# Altium footprint library Conectors.PcbLib: 123 footprints (part 5 of 8)
Each footprint in its own frame and in the unit in brackets; x right, y up, seen from the top. Pads: shape width x height; smd on the part's side, far side on the other; paste and mask are expansions set on the pad; w line width, h text height; cw(c..) or ccw(c..) is an arc to the next point about the centre after c.
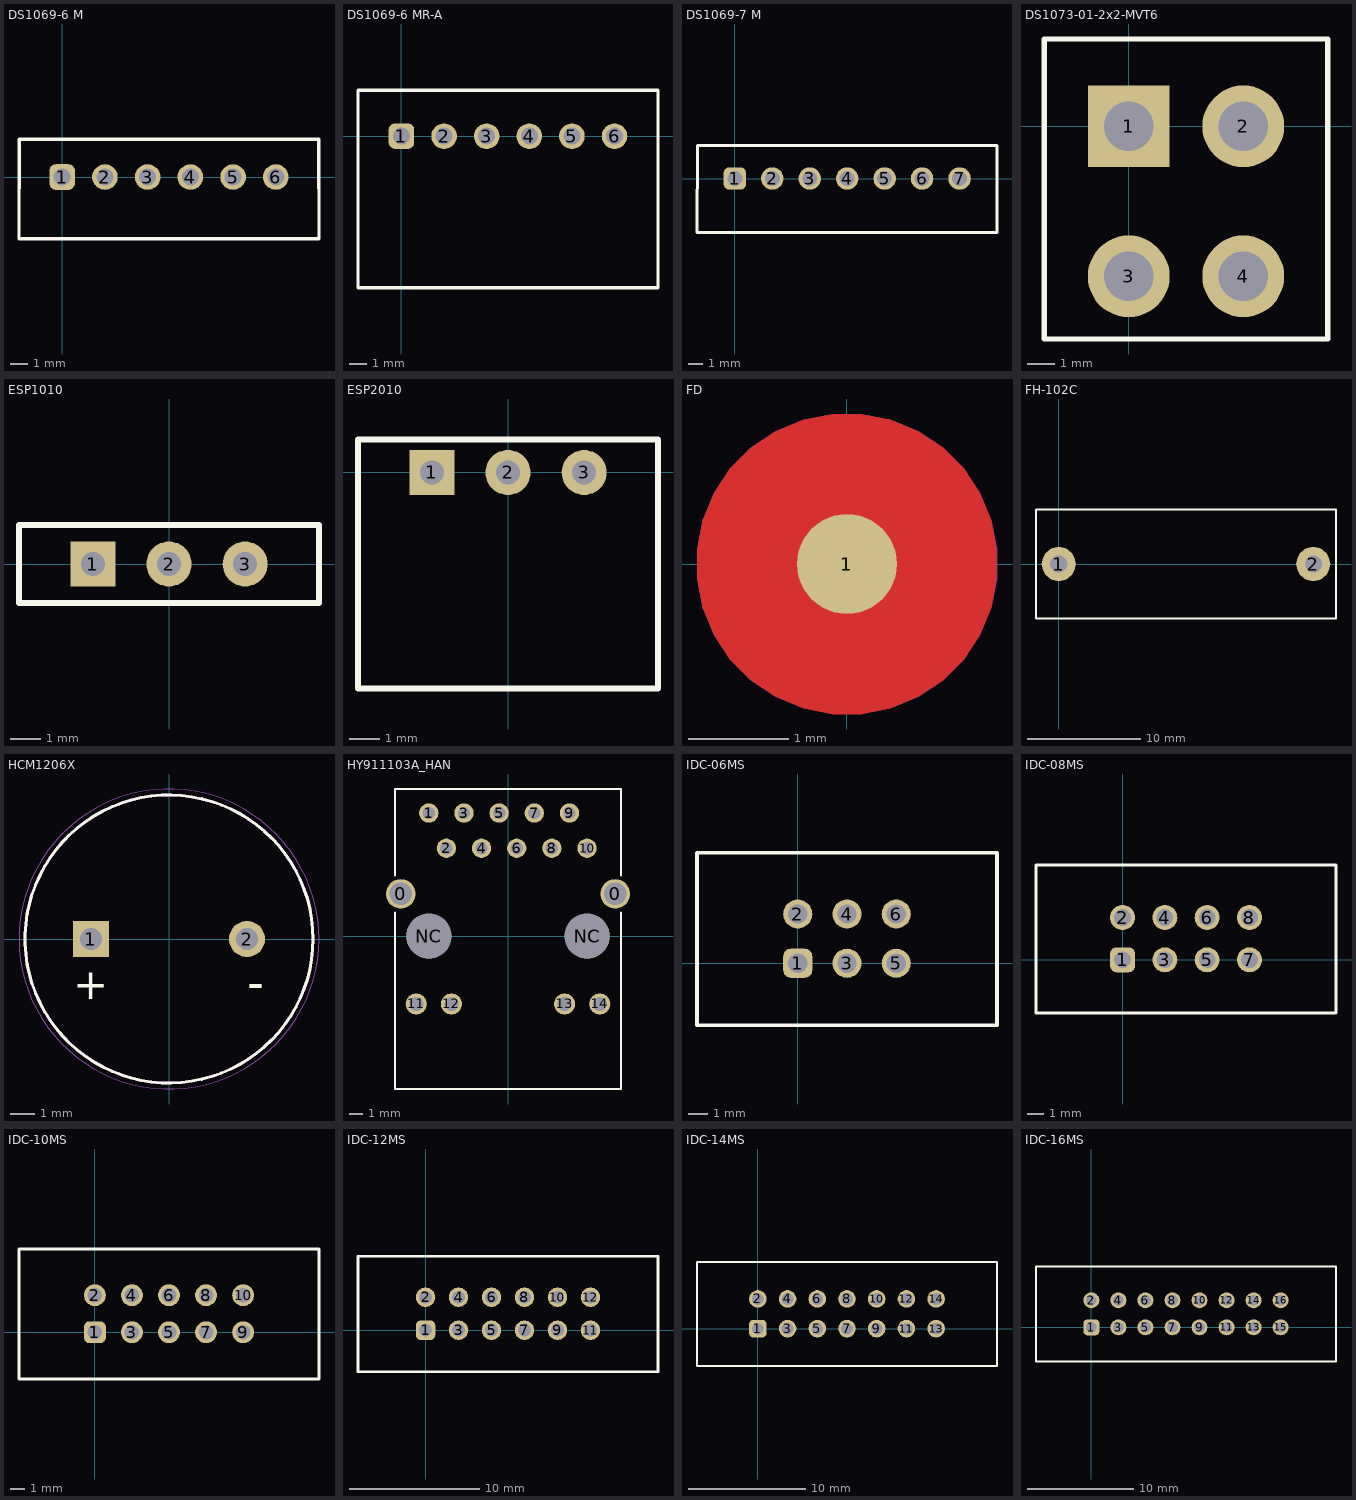
[diagram p4: the footprints below, top view; thin cyan lines are the x and y axes]

## DS1069-6 M [mm]
pads (6):
  rrect50% 1.5x1.5 hole 1: 1(0,0)
  round 1.5 hole 1: 2(2.5,0) 3(5,0) 4(7.5,0) 5(10,0) 6(12.5,0)
Top Overlay:
  lines w0.2: -2.526,-3.6 15.026,-3.6 15,2.2 -2.5,2.2 -2.526,-3.6
3D body "User Library-CWF-6.step": height 7, standoff -3.5, extent -2.5,-3.55 15,2.2

## DS1069-6 MR-A [mm]
pads (6):
  rrect50% 1.5x1.5 hole 1: 1(0,0)
  round 1.5 hole 1: 2(2.5,0) 3(5,0) 4(7.5,0) 5(10,0) 6(12.5,0)
Top Overlay:
  lines w0.2: -2.55,-8.9 15.05,-8.9 15.05,2.7 -2.55,2.7 -2.55,-8.9
3D body "User Library-DS1069-6 CWF-6R.step": height 5.75, standoff -3.5, extent -2.5,-8.88 15,2.62

## DS1069-7 M [mm]
pads (7):
  rrect50% 1.5x1.5 hole 1: 1(0,0)
  round 1.5 hole 1: 2(2.5,0) 3(5,0) 4(7.5,0) 5(10,0) 6(12.5,0) 7(15,0)
Top Overlay:
  lines w0.2: -2.526,-3.6 17.5,-3.6 17.5,2.2 -2.5,2.2 -2.526,-3.6
3D body "User Library-CWF-7.step": height 7, standoff -3.5, extent -2.5,-3.55 17.5,2.2

## DS1073-01-2x2-MVT6 [mm]
pads (4):
  rect 3x3 hole 1.8: 1(0,0)
  round 3 hole 1.8: 2(4.2,0) 3(0,-5.5) 4(4.2,-5.5)
Top Overlay:
  lines w0.2: -3.1,-7.8 7.3,-7.8 7.3,3.2 -3.1,3.2 -3.1,-7.8
3D body "039310040.stp": height 12.8, standoff -3.5, extent -3.1,-7.8 7.3,3.2

## ESP1010 [mm]
pads (3):
  rect 1.5x1.5 hole 0.8: 1(-2.54,0)
  round 1.5 hole 0.8: 2(0,0) 3(2.54,0)
Top Overlay:
  lines w0.2: -5,-1.3 -5,1.3 5,1.3 5,-1.3 -5,-1.3
3D body "slide_switch.stp": height 6.5, standoff -5.5, extent -5,-1.25 5,1.25

## ESP2010 [mm]
pads (3):
  rect 1.5x1.5 hole 0.8: 1(-2.54,0)
  round 1.5 hole 0.8: 2(0,0) 3(2.54,0)
Top Overlay:
  lines w0.2: -5,-7.2 5,-7.2 5,1.1 -5,1.1 -5,-7.2
3D body "Деталь3.STEP": height 2.5, standoff -2.55, extent -5,-7.2 5,0.25

## FD [mm]
pads (1):
  round 1 all layers, no hole paste+0 mask+0: 1(0,0)
Top Layer:
  pour cut-out: -1.5,0 -1.5,-0.148 -1.442,-0.438 -1.329,-0.711 -1.165,-0.956 -0.956,-1.165 -0.711,-1.329 -0.438,-1.442 -0.148,-1.5 0,-1.5 0.148,-1.5 0.438,-1.442 0.711,-1.329 0.956,-1.165 1.165,-0.956 1.329,-0.711 1.442,-0.438 1.5,-0.148 1.5,0 1.5,0.148 1.442,0.438 1.329,0.711 1.165,0.956 0.956,1.165 0.711,1.329 0.438,1.442 0.148,1.5 0,1.5 -0.148,1.5 -0.438,1.442 -0.711,1.329 -0.956,1.165 -1.165,0.956 -1.329,0.711 -1.442,0.438 -1.5,0.148
Bottom Layer:
  pour cut-out: -1.5,0 -1.5,-0.148 -1.442,-0.438 -1.329,-0.711 -1.165,-0.956 -0.956,-1.165 -0.711,-1.329 -0.438,-1.442 -0.148,-1.5 0,-1.5 0.148,-1.5 0.438,-1.442 0.711,-1.329 0.956,-1.165 1.165,-0.956 1.329,-0.711 1.442,-0.438 1.5,-0.148 1.5,0 1.5,0.148 1.442,0.438 1.329,0.711 1.165,0.956 0.956,1.165 0.711,1.329 0.438,1.442 0.148,1.5 0,1.5 -0.148,1.5 -0.438,1.442 -0.711,1.329 -0.956,1.165 -1.165,0.956 -1.329,0.711 -1.442,0.438 -1.5,0.148

## FH-102C [mm]
pads (2):
  round 3 hole 1.5: 1(0,0) 2(22.4,0)
Top Overlay:
  lines w0.2: -2,-4.8 -2,4.8 24.4,4.8 24.4,-4.8 -2,-4.8
3D body "FH-102C.stp": height 15.5, standoff -5.1, extent -1.95,-4.75 24.35,4.75

## HCM1206X [mm]
pads (2):
  rect 1.5x1.5 hole 0.9: 1(-3.25,0)
  round 1.5 hole 0.9: 2(3.25,0)
Top Overlay:
  circle w0.127: c0,0 r6
  text "+" at -4,-2.5 h1.27
  text "-" at 3.25,-2.5 h1.42
Mechanical 13:
  circle w0.127: c0,0 r6
Mechanical 15:
  circle w0.05: c0,0 r6.25
3D body "CMT-1285C-035.STEP": height 8.51, standoff -5.49, extent -6,-6 6,6

## HY911103A_HAN [mil]
pads (18):
  round 84 hole 64: 0(-304.92,120.08) 0(304.92,120.08)
  round 55 hole 35 mask+0: 1(-225.2,350) 2(-175.2,250) 3(-125.2,350) 4(-75.2,250) 5(-25.2,350) 6(24.8,250) 7(74.8,350) 8(124.8,250) 9(174.8,350) 10(224.8,250)
  round 60 hole 40 mask+0: 11(-260.83,-192.91) 12(-160.83,-192.91) 13(160.83,-192.91) 14(260.83,-192.91)
  round 128 hole 128 unplated: NC(-225,0) NC(225,0)
Top Overlay:
  lines w6: -321,67.38 -321,-434.61 321,-434.61 321,67.38 ; -321,172.78 -321,418.39 321,418.39 321,172.78
3D body "HR911130A.sldprt": height 551.18, standoff -98.43, extent -312.01,-429.53 313.19,412.99

## IDC-06MS [mm]
pads (6):
  rrect50% 1.5x1.5 hole 1: 1(0,0)
  round 1.5 hole 1: 2(0,2.54) 3(2.54,0) 4(2.54,2.54) 5(5.08,0) 6(5.08,2.54)
Top Overlay:
  lines w0.2: -5.2,-3.2 10.28,-3.2 10.28,5.7 -5.2,5.7 -5.2,-3.2
3D body "DS1013-6S (IDC-6MS CONNFLY).stp": height 9, standoff -3.6, extent -5.17,-3.13 10.25,5.67

## IDC-08MS [mm]
pads (8):
  rrect50% 1.5x1.5 hole 1: 1(0,0)
  round 1.5 hole 1: 2(0,2.54) 3(2.54,0) 4(2.54,2.54) 5(5.08,0) 6(5.08,2.54) 7(7.62,0) 8(7.62,2.54)
Top Overlay:
  lines w0.2: -5.2,-3.2 -5.2,5.7 12.82,5.7 12.82,-3.2 -5.2,-3.2
3D body "DS1013-8S (IDC-8MS CONNFLY).stp": height 9, standoff -3.6, extent -5.17,-3.23 12.79,5.67

## IDC-10MS [mm]
pads (10):
  rrect50% 1.5x1.5 hole 1: 1(0,0)
  round 1.5 hole 1: 2(0,2.54) 3(2.54,0) 4(2.54,2.54) 5(5.08,0) 6(5.08,2.54) 7(7.62,0) 8(7.62,2.54) 9(10.16,0) 10(10.16,2.54)
Top Overlay:
  lines w0.2: -5.2,-3.2 -5.2,5.7 15.36,5.7 15.36,-3.2 -5.2,-3.2
3D body "DS1013-10S (IDC-10MS CONNFLY).stp": height 9, standoff -3.6, extent -5.17,-3.23 15.33,5.67

## IDC-12MS [mm]
pads (12):
  rrect50% 1.5x1.5 hole 1: 1(0,0)
  round 1.5 hole 1: 2(0,2.54) 3(2.54,0) 4(2.54,2.54) 5(5.08,0) 6(5.08,2.54) 7(7.62,0) 8(7.62,2.54) 9(10.16,0) 10(10.16,2.54) 11(12.7,0) 12(12.7,2.54)
Top Overlay:
  lines w0.2: -5.2,-3.2 17.9,-3.2 17.9,5.7 -5.2,5.7 -5.2,-3.2
3D body "DS1013-12S (IDC-12MS CONNFLY).stp": height 9, standoff -3.6, extent -5.17,-3.23 17.87,5.67

## IDC-14MS [mm]
pads (14):
  rrect50% 1.5x1.5 hole 1: 1(0,0)
  round 1.5 hole 1: 2(0,2.54) 3(2.54,0) 4(2.54,2.54) 5(5.08,0) 6(5.08,2.54) 7(7.62,0) 8(7.62,2.54) 9(10.16,0) 10(10.16,2.54) 11(12.7,0) 12(12.7,2.54) 13(15.24,0) 14(15.24,2.54)
Top Overlay:
  lines w0.2: -5.2,-3.2 20.44,-3.2 20.44,5.7 -5.2,5.7 -5.2,-3.2
3D body "DS1013-14S (IDC-14MS CONNFLY).stp": height 9, standoff -3.6, extent -5.17,-3.23 20.41,5.67

## IDC-16MS [mm]
pads (16):
  rrect50% 1.5x1.5 hole 1: 1(0,0)
  round 1.5 hole 1: 2(0,2.54) 3(2.54,0) 4(2.54,2.54) 5(5.08,0) 6(5.08,2.54) 7(7.62,0) 8(7.62,2.54) 9(10.16,0) 10(10.16,2.54) 11(12.7,0) 12(12.7,2.54) 13(15.24,0) 14(15.24,2.54) 15(17.78,0) 16(17.78,2.54)
Top Overlay:
  lines w0.2: -5.2,-3.2 -5.2,5.7 22.98,5.7 22.98,-3.2 -5.2,-3.2
3D body "DS1013-16S (IDC-16MS CONNFLY).stp": height 9, standoff -3.6, extent -5.17,-3.23 22.95,5.67